# Altium footprint library CONNECTOR.PcbLib: 59 footprints (part 1 of 4)
Each footprint in its own frame and in the unit in brackets; x right, y up, seen from the top. Pads: shape width x height; smd on the part's side, far side on the other; paste and mask are expansions set on the pad; w line width, h text height; cw(c..) or ccw(c..) is an arc to the next point about the centre after c.
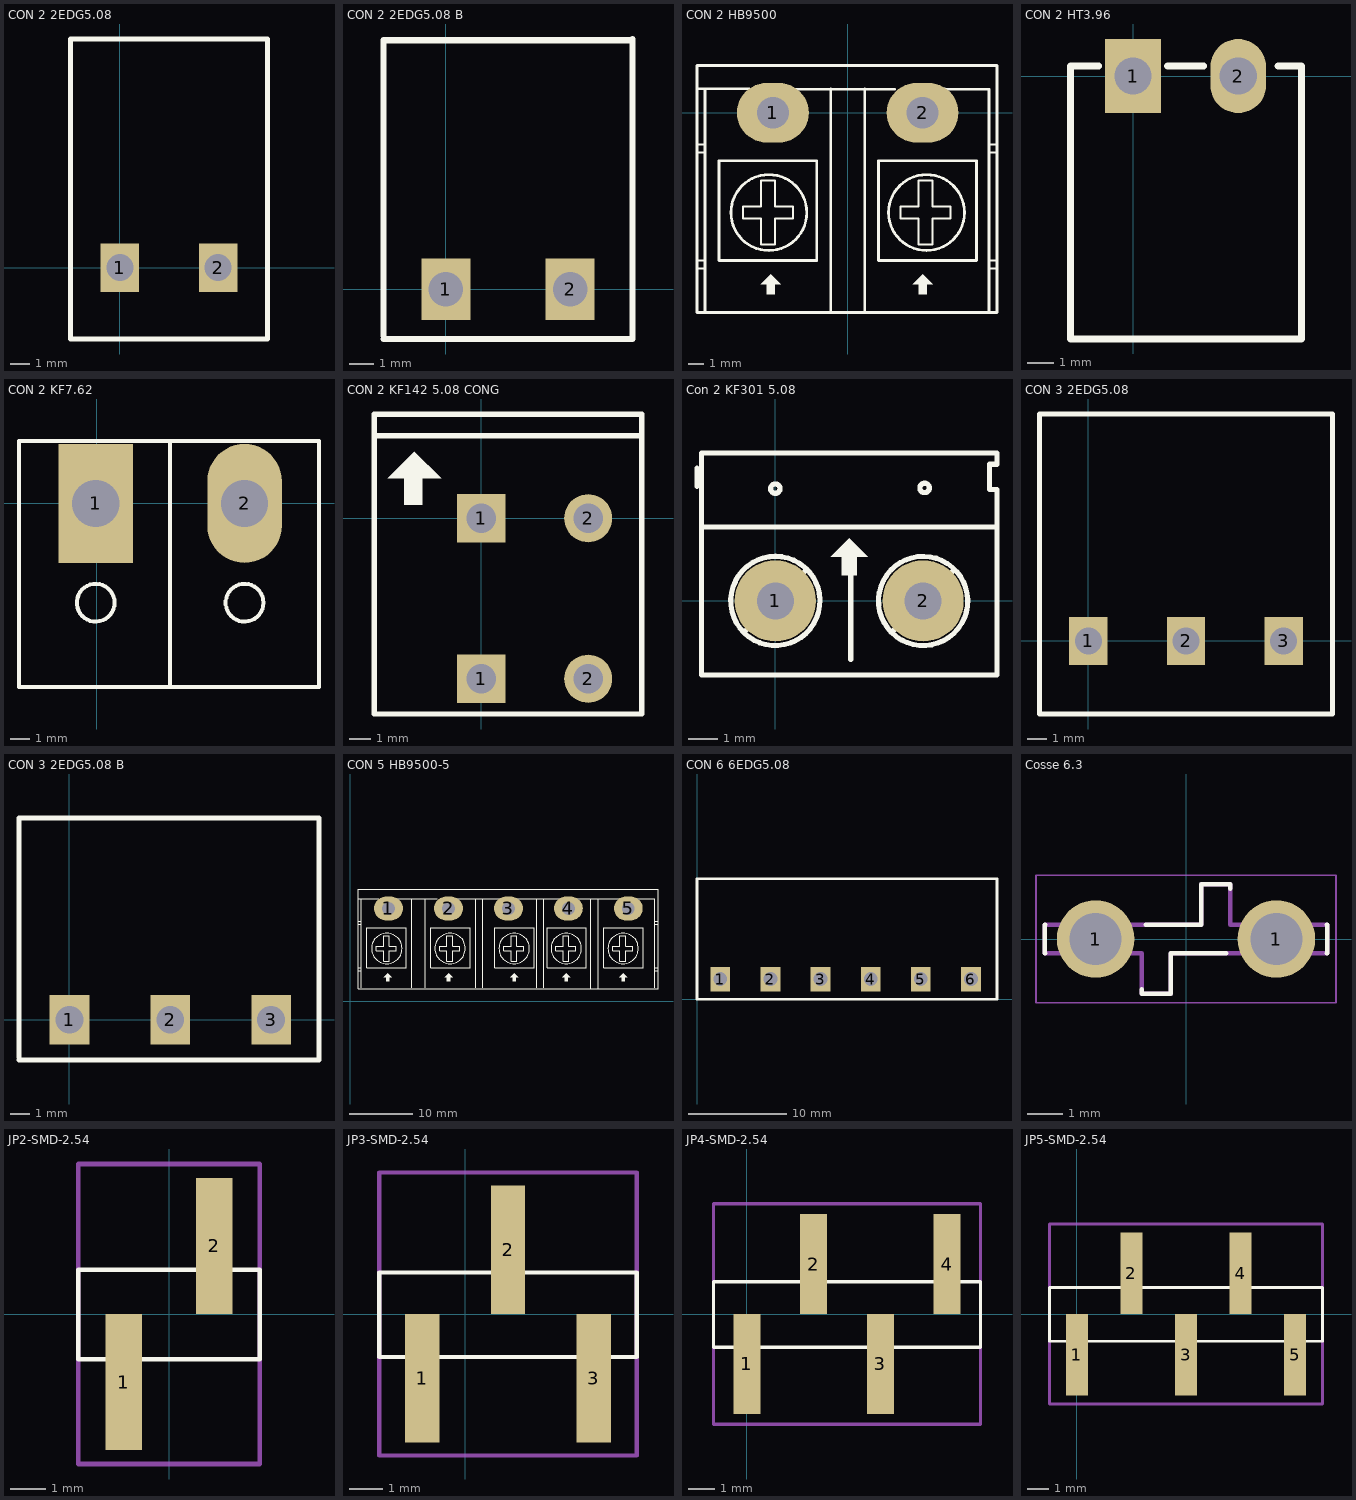
[diagram p0: the footprints below, top view; thin cyan lines are the x and y axes]

## CON 2 2EDG5.08 [mm]
pads (2):
  rect 2x2.5 hole 1.4: 1(0,0) 2(5.08,0)
Top Overlay:
  lines w0.254: -2.54,-3.683 7.62,-3.683 7.62,11.811 -2.54,11.811 -2.54,-3.683
3D body "User Library 2EDG 5 08-02P.step": height 21.08, standoff -4, extent -2.54,-3.741 7.62,11.869

## CON 2 2EDG5.08 B [mm]
pads (2):
  rect 2x2.5 hole 1.4: 1(0,0) 2(5.08,0)
Top Overlay:
  lines w0.254: -2.54,-2.032 7.62,-2.032 7.62,10.211 ; -2.54,-1.905 -2.54,10.173 ; -2.54,10.16 7.62,10.16
3D body "User Library-BigHeader 5EHDR_1P.step": height 3.15, standoff -9.32, extent -2.5,-1.75 2.5,10.25
3D body "User Library-BigHeader 5EHDR_1P.step": height 3.15, standoff -9.32, extent 2.58,-1.75 7.58,10.25

## CON 2 HB9500 [mil] "Header 2: 300V-20A, 2 pin, hight 300mil, Pin to Pin 400, Colour Green"
height 300
pads (2):
  oval 180x150 hole 80: 1(-187.5,0) 2(187.5,0)
Top Overlay:
  circle w7: c-197.5,-250 r95
  circle w7: c197.5,-250 r95
  region: -192.5,-405 -217.5,-430 -202.5,-430 -202.5,-455 -182.5,-455 -182.5,-430 -167.5,-430
  region: 187.5,-405 162.5,-430 177.5,-430 177.5,-455 197.5,-455 197.5,-430 212.5,-430
  lines w5: -375,-390 -360,-390 ; -375,-370 -360,-370 ; -375,-100 -360,-100 ; -375,-80 -360,-80 ; 355,-390 370,-390 ; 355,-370 370,-370 ; 355,-100 370,-100 ; 355,-80 370,-80 ; -262.5,-265 -217.5,-265 -217.5,-330 -182.5,-330 -182.5,-265 -137.5,-265 -137.5,-235 -182.5,-235 -182.5,-170 -217.5,-170 -217.5,-235 -262.5,-235 -262.5,-265 ; 132.5,-265 177.5,-265 177.5,-330 212.5,-330 212.5,-265 257.5,-265 257.5,-235 212.5,-235 212.5,-170 177.5,-170 177.5,-235 132.5,-235 132.5,-265
  lines w7: -377.5,60 -247.5,60 ; -357.5,-495 -357.5,60 ; -131.89,59.06 118.11,59.06 ; -42.5,-495 -42.5,60 ; 42.5,-495 42.5,60 ; 242.5,60 242.5,59.13 354.33,59.04 354.33,-495 ; -377.5,-500 374.02,-500 374.02,118.11 -377.5,118.11 -377.5,-500 ; -322.5,-370 -322.5,-120 -77.5,-120 -77.5,-370 -322.5,-370 ; 77.5,-370 77.5,-120 322.5,-120 322.5,-370 77.5,-370
3D body "CON 2 HB.stp": height 500.6, standoff -199.4, extent -366,-485 345,115

## CON 2 HT3.96 [mm]
pads (2):
  rect 2.1x2.794 hole 1.4: 1(0,0)
  oval 2.1x2.794 hole 1.4: 2(3.96,0)
Top Overlay:
  lines w0.254: -1.295,0.381 -2.286,0.381 -2.362,0.381 -2.362,-9.906 6.35,-9.906 6.35,0.381 5.461,0.381 ; 1.295,0.381 2.667,0.381
3D body "Con 2 KF396.stp": height 7.02, standoff 0.02, extent -1.968,-10 6.032,0

## CON 2 KF7.62 [mil]
pads (2):
  rect 150x240 hole 95: 1(-2,0)
  oval 150x240 hole 95: 2(298,0)
Top Overlay:
  circle w8: c-2,-200 r38.08
  circle w8: c298,-200 r38.08
  lines w7.87: 148,-368.06 148,126 ; -156.54,-370 -156.54,-339.27 -156.54,126 448,126 448,-370 -156.54,-370
3D body "Con 2 KF7.62.step": height 492.61, standoff -245.58, extent -152,-370 448,122.12

## CON 2 KF142 5.08 CONG [mil]
pads (4):
  rect 90x90 hole 55.12: 1(0,-300.39) 1(0,0)
  round 90 hole 55.12: 2(200,-300.39) 2(200,0)
Top Overlay:
  rectangle: -145,24.61 -110,74.61
  region: -175,74.61 -125,124.61 -75,74.61
  lines w10: -200,64.61 -200,154.61 ; -200,65.61 -200,-366.39 300,-366.39 ; 300,-365 300,195 ; 300,154.61 -200,154.61 ; 300,194.61 -200,194.61 -200,154.61
3D body "Terminal Blocks Fixed SPRING 2PIN CONG.stp": height 520.69, standoff -137.32, extent -205,-375.35 293.43,185.35

## Con 2 KF301 5.08 [mil]
pads (2):
  round 110 hole 50: 1(0,0) 2(200,0)
Top Overlay:
  circle w7: c0,152 r6.4
  circle w7: c202,153 r6.4
  region: 100,85 75,60 90,60 90,35 110,35 110,60 125,60
  lines w7: -106,155 -106,180 ; -100,100 300,100 ; -42,-42 43,43 ; 39.04,46.05 ccw(c0,0) 45.18,40.05 ; 102,-79 102,72 ; 158,-42 242.5,42.5 ; 239.76,45.44 ccw(c200,0) 245.18,40.05 ; 290,182 290,151 300,151 300,-100 -100,-100 -100,50 -100,200 300,200 300,185 290,185 ; 300,-79 300,40
3D body "Con 2 KF301.stp": height 335.25, standoff -137.19, extent -45,-97.4 255,190

## CON 3 2EDG5.08 [mm]
pads (3):
  rect 2x2.5 hole 1.4: 1(0,0) 2(5.08,0) 3(10.16,0)
Top Overlay:
  lines w0.254: -2.54,-3.81 -2.54,11.811 12.7,11.811 12.7,-3.81 -2.54,-3.81
3D body "User Library 2EDG 5 Aug 03P.step": height 21.08, standoff -4, extent -2.54,-3.81 12.7,11.8

## CON 3 2EDG5.08 B [mm]
pads (3):
  rect 2x2.5 hole 1.4: 1(0,0) 2(5.08,0) 3(10.16,0)
Top Overlay:
  lines w0.254: -2.54,-2.032 12.573,-2.032 12.573,10.16 -2.54,10.16 -2.54,-1.905
3D body "User Library-BigHeader 5EHDR_1P.step": height 3.15, standoff -9.32, extent 2.58,-1.75 7.58,10.25
3D body "User Library-BigHeader 5EHDR_1P.step": height 3.15, standoff -9.32, extent -2.5,-1.75 2.5,10.25
3D body "User Library-BigHeader 5EHDR_1P.step": height 3.15, standoff -9.32, extent 7.66,-1.75 12.66,10.25

## CON 5 HB9500-5 [mil] "Header 2: 300V-20A, 5 pin, hight 300mil, Pin to Pin 400, Colour Green"
height 300
pads (5):
  oval 180x150 hole 80: 1(237.5,580) 2(612.5,580) 3(986.5,580) 4(1360.51,580) 5(1734.53,580)
Top Overlay:
  circle w7: c227.5,330 r95
  circle w7: c622.5,330 r95
  circle w7: c1022.5,330 r95
  circle w7: c1347.5,330 r95
  circle w7: c1702.5,330 r95
  region: 232.5,175 207.5,150 222.5,150 222.5,125 242.5,125 242.5,150 257.5,150
  region: 612.5,175 587.5,150 602.5,150 602.5,125 622.5,125 622.5,150 637.5,150
  region: 1022.5,175 997.5,150 1012.5,150 1012.5,125 1032.5,125 1032.5,150 1047.5,150
  region: 1347.5,175 1322.5,150 1337.5,150 1337.5,125 1357.5,125 1357.5,150 1372.5,150
  region: 1702.5,175 1677.5,150 1692.5,150 1692.5,125 1712.5,125 1712.5,150 1727.5,150
  lines w5: 162.5,315 207.5,315 207.5,250 242.5,250 242.5,315 287.5,315 287.5,345 242.5,345 242.5,410 207.5,410 207.5,345 162.5,345 162.5,315 ; 557.5,315 602.5,315 602.5,250 637.5,250 637.5,315 682.5,315 682.5,345 637.5,345 637.5,410 602.5,410 602.5,345 557.5,345 557.5,315 ; 957.5,315 1002.5,315 1002.5,250 1037.5,250 1037.5,315 1082.5,315 1082.5,345 1037.5,345 1037.5,410 1002.5,410 1002.5,345 957.5,345 957.5,315 ; 1282.5,315 1327.5,315 1327.5,250 1362.5,250 1362.5,315 1407.5,315 1407.5,345 1362.5,345 1362.5,410 1327.5,410 1327.5,345 1282.5,345 1282.5,315 ; 1637.5,315 1682.5,315 1682.5,250 1717.5,250 1717.5,315 1762.5,315 1762.5,345 1717.5,345 1717.5,410 1682.5,410 1682.5,345 1637.5,345 1637.5,315
  lines w7: 47.5,640 177.5,640 ; 50,190 65,190 ; 50,210 65,210 ; 50,480 65,480 ; 50,500 65,500 ; 67.5,85 67.5,640 ; 293.11,639.06 543.11,639.06 ; 382.5,85 382.5,640 ; 467.5,85 467.5,640 ; 667.5,640 667.5,639.13 779.33,639.04 1899.33,639.04 1899.33,85 ; 782.5,85 782.5,640 ; 827.5,85 827.5,640 ; 1161.73,85.28 1161.73,640.28 ; 1206.73,85.28 1206.73,640.28 ; 1501.73,80.28 1501.73,635.28 ; 1546.73,80.28 1546.73,635.28 ; 1900,190 1915,190 ; 1900,210 1915,210 ; 1900,480 1915,480 ; 1900,500 1915,500 ; 47.5,80 800,80 1920,80 1920,698.11 891.89,698.11 800,698.11 47.5,698.11 47.5,80 ; 102.5,210 102.5,460 347.5,460 347.5,210 102.5,210 ; 502.5,210 502.5,460 747.5,460 747.5,210 502.5,210 ; 902.5,210 902.5,460 1147.5,460 1147.5,210 902.5,210 ; 1227.5,210 1227.5,460 1472.5,460 1472.5,210 1227.5,210 ; 1582.5,210 1582.5,460 1827.5,460 1827.5,210 1582.5,210
3D body "terminal_block_5_49mm v15.step": height 551.18, standoff 0, extent -2.76,0.67 1950,709.33

## CON 6 6EDG5.08 [mm]
pads (6):
  rect 2x2.5 hole 1.4: 1(2.362,2.057) 2(7.442,2.057) 3(12.522,2.057) 4(17.602,2.057) 5(22.682,2.057) 6(27.762,2.057)
Top Overlay:
  lines w0.254: 16.205,12.217 30.404,12.217 30.404,0.025 30.302,0.025 20.142,0.025 9.982,0.025 0,0.025 0,12.217 20.142,12.217
3D body "User Library-BigHeader 5EHDR_1P.step": height 3.15, standoff -9.32, extent 25.262,0.308 30.262,12.308
3D body "User Library-BigHeader 5EHDR_1P.step": height 3.15, standoff -9.32, extent 20.182,0.308 25.182,12.308
3D body "User Library-BigHeader 5EHDR_1P.step": height 3.15, standoff -9.32, extent 15.102,0.308 20.102,12.308
3D body "User Library-BigHeader 5EHDR_1P.step": height 3.15, standoff -9.32, extent 10.022,0.308 15.022,12.308
3D body "User Library-BigHeader 5EHDR_1P.step": height 3.15, standoff -9.32, extent 4.942,0.308 9.942,12.308
3D body "User Library-BigHeader 5EHDR_1P.step": height 3.15, standoff -9.32, extent -0.138,0.308 4.862,12.308

## Cosse 6.3 [mm]
pads (2):
  round 2.175 hole 1.45: 1(-2.54,0) 1(2.54,0)
Top Overlay:
  lines w0.127: -3.948,-0.4 -3.962,-0.4 -3.962,0.4 -3.948,0.4 ; -1.245,-1.408 -1.245,-1.543 -0.432,-1.543 -0.432,-0.4 1.132,-0.4 ; -1.132,0.4 0.432,0.4 0.432,1.543 1.245,1.543 1.245,1.408 ; 3.948,-0.4 3.962,-0.4 3.962,0.4 3.948,0.4
Mechanical 13:
  lines w0.127: -3.962,-0.4 -3.962,0.4 0.432,0.4 0.432,1.543 1.245,1.543 1.245,0.4 3.962,0.4 3.962,-0.4 -0.432,-0.4 -0.432,-1.543 -1.245,-1.543 -1.245,-0.4 -3.962,-0.4
Mechanical 15:
  lines w0.05: -4.212,-1.793 -4.212,1.793 4.212,1.793 4.212,-1.793 -4.212,-1.793
3D body "step_temp.STEP": height 10.1, standoff -3.92, extent -3.962,-1.543 3.962,1.543

## JP2-SMD-2.54 [mm]
pads (2):
  rect 1.02x3.8 smd: 1(-1.27,-1.9) 2(1.27,1.9)
Top Overlay:
  lines w0.127: -2.54,-1.27 2.54,-1.27 2.54,1.23 -2.54,1.23 -2.54,-1.27
Mechanical 1:
  lines w0.127: -2.54,-4.191 -2.54,4.191 2.54,4.191 2.54,-4.191 -2.54,-4.191
3D body "jp2-smd.STEP": height 10.3, standoff -0.02, extent -2.54,-4.191 2.54,4.309

## JP3-SMD-2.54 [mm]
pads (3):
  rect 1.02x3.8 smd: 1(-1.27,-1.9) 2(1.27,1.9) 3(3.81,-1.9)
Top Overlay:
  lines w0.127: -2.54,-1.27 5.08,-1.27 5.08,1.23 -2.54,1.23 -2.54,-1.27
Mechanical 1:
  lines w0.127: -2.54,-4.191 -2.54,4.191 5.08,4.191 5.08,-4.191 -2.54,-4.191
3D body "jp3.STEP": height 10.3, standoff -0.02, extent -2.54,-4.25 5.08,4.25

## JP4-SMD-2.54 [mm]
pads (4):
  rect 1.02x3.8 smd: 1(0,-1.9) 2(2.54,1.9) 3(5.08,-1.9) 4(7.62,1.9)
Top Overlay:
  lines w0.127: -1.27,-1.27 8.89,-1.27 8.89,1.23 -1.27,1.23 -1.27,-1.27
Mechanical 1:
  lines w0.127: -1.27,-4.191 -1.27,4.191 8.89,4.191 8.89,-4.191 -1.27,-4.191
3D body "jp4.STEP": height 10.3, standoff -0.02, extent -1.27,-4.25 8.89,4.25

## JP5-SMD-2.54 [mm]
pads (5):
  rect 1.02x3.8 smd: 1(0,-1.9) 2(2.54,1.9) 3(5.08,-1.9) 4(7.62,1.9) 5(10.16,-1.9)
Top Overlay:
  lines w0.127: -1.27,-1.27 -1.27,1.23 11.43,1.23 11.43,-1.27 -1.27,-1.27
Mechanical 1:
  lines w0.127: -1.27,-4.191 11.43,-4.191 11.43,4.191 -1.27,4.191 -1.27,-4.191
3D body "jp5.STEP": height 10.3, standoff -0.02, extent -1.27,-4.25 11.43,4.25